# Altium footprint library Single Board Computers (SBCs), Computer On Module (COM).PcbLib: 1 footprints
Each footprint in its own frame and in the unit in brackets; x right, y up, seen from the top. Pads: shape width x height; smd on the part's side, far side on the other; paste and mask are expansions set on the pad; w line width, h text height; cw(c..) or ccw(c..) is an arc to the next point about the centre after c.
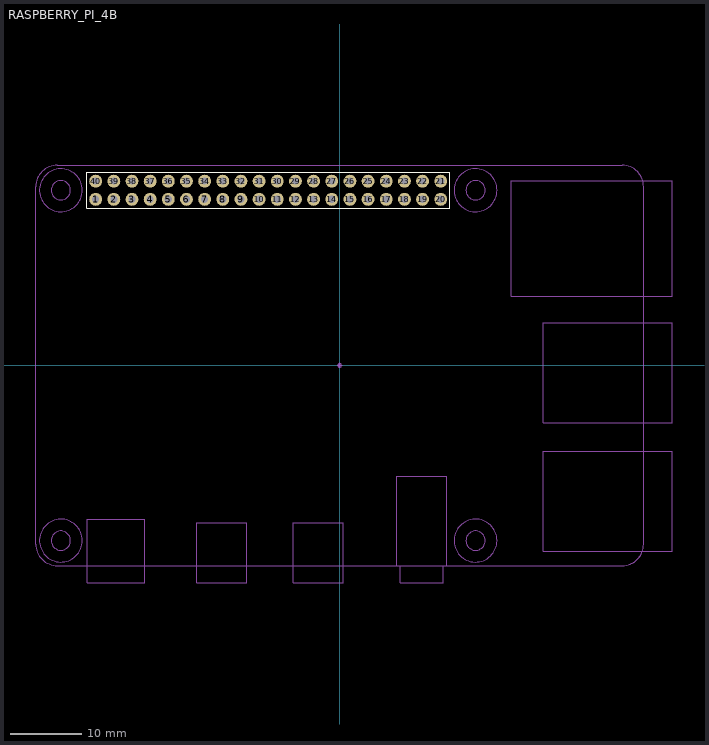
[diagram p0: the footprint, top view; thin cyan lines are the x and y axes]

## RASPBERRY_PI_4B [mm]
pads (40):
  round 1.8 hole 1: 1(-34.13,23.23) 2(-31.59,23.23) 3(-29.05,23.23) 4(-26.51,23.23) 5(-23.97,23.23) 6(-21.43,23.23) 7(-18.89,23.23) 8(-16.35,23.23) 9(-13.81,23.23) 10(-11.27,23.23) 11(-8.73,23.23) 12(-6.19,23.23) 13(-3.65,23.23) 14(-1.11,23.23) 15(1.43,23.23) 16(3.97,23.23) 17(6.51,23.23) 18(9.05,23.23) 19(11.59,23.23) 20(14.13,23.23) 21(14.13,25.77) 22(11.59,25.77) 23(9.05,25.77) 24(6.51,25.77) 25(3.97,25.77) 26(1.43,25.77) 27(-1.11,25.77) 28(-3.65,25.77) 29(-6.19,25.77) 30(-8.73,25.77) 31(-11.27,25.77) 32(-13.81,25.77) 33(-16.35,25.77) 34(-18.89,25.77) 35(-21.43,25.77) 36(-23.97,25.77) 37(-26.51,25.77) 38(-29.05,25.77) 39(-31.59,25.77) 40(-34.13,25.77)
Top Overlay:
  lines w0.1: -35.4,21.96 -35.4,27.04 15.4,27.04 15.4,21.96 -35.4,21.96
Mechanical 13:
  circle w0.025: c-39,24.5 r1.35
  circle w0.025: c-39,24.5 r3
  circle w0.025: c-39,-24.5 r1.35
  circle w0.025: c-39,-24.5 r3
  circle w0.025: c19,24.5 r3
  circle w0.025: c19,24.5 r1.35
  circle w0.025: c19,-24.5 r1.35
  circle w0.025: c19,-24.5 r3
  lines w0.025: 8,-28 8,-15.5 15,-15.5 15,-28 ; 42.328,-26.001 cw(c39.5,-25) 39.5,-28 14.5,-28 14.5,-30.4 8.5,-30.4 8.5,-28 0.5,-28 ; 42.391,25.8 46.5,25.8 46.5,9.7 42.5,9.7 ; -35.3,-30.4 -35.3,-28 ; -35.3,-30.4 -27.3,-30.4 -27.3,-28 ; -35.3,-30.4 -35.3,-30.4 ; -35.3,-28 -35.3,-21.5 -27.3,-21.5 -27.3,-28 ; -35.3,-28 -39.5,-28 cw(c-39.5,-25) -42.5,-25 -42.5,25 cw(c-39.5,25) -39.5,28 39.5,28 cw(c39.5,25) 42.391,25.802 42.389,25.8 24,25.8 24,9.7 42.5,9.7 ; -27.3,-28 -20,-28 ; -20,-28 -20,-22 -13,-22 -13,-28 ; -20,-28 -20,-30.4 -13,-30.4 -13,-28 ; -13,-28 -6.5,-28 ; -6.5,-28 -6.5,-30.4 0.5,-30.4 0.5,-28 ; -6.5,-28 -6.5,-22 0.5,-22 0.5,-28 ; 42.5,-12 46.5,-12 46.5,-26 42.328,-26 28.5,-26 28.5,-12 42.5,-12 ; 42.5,-12 42.5,-8 ; 42.5,-8 46.5,-8 46.5,6 42.5,6 ; 42.5,-8 28.5,-8 28.5,6 42.5,6 ; 42.5,6 42.5,9.7
Mechanical 15:
  circle w0.05: c0,0 r0.25
  lines w0.05: -0.35,0 0.35,0 ; 0,-0.35 0,0.35
  lines w0.1: -42.5,-25 ccw(c-39.5,-25) -39.5,-28 39.5,-28 ccw(c39.5,-25) 42.5,-25 42.5,25 ccw(c39.5,25) 39.5,28 -39.5,28 ccw(c-39.5,25) -42.5,25 -42.5,-25
3D body "DS1023-2x20SF11.stp": height 2.5, standoff -9, extent -35.8,22 15.8,27
3D body "Raspberry Pi 4 Model B.STEP": height 0, standoff -19.9, extent -42.5,-30.4 46.49,28